# Altium footprint library connector.PcbLib: 67 footprints (part 4 of 5)
Each footprint in its own frame and in the unit in brackets; x right, y up, seen from the top. Pads: shape width x height; smd on the part's side, far side on the other; paste and mask are expansions set on the pad; w line width, h text height; cw(c..) or ccw(c..) is an arc to the next point about the centre after c.
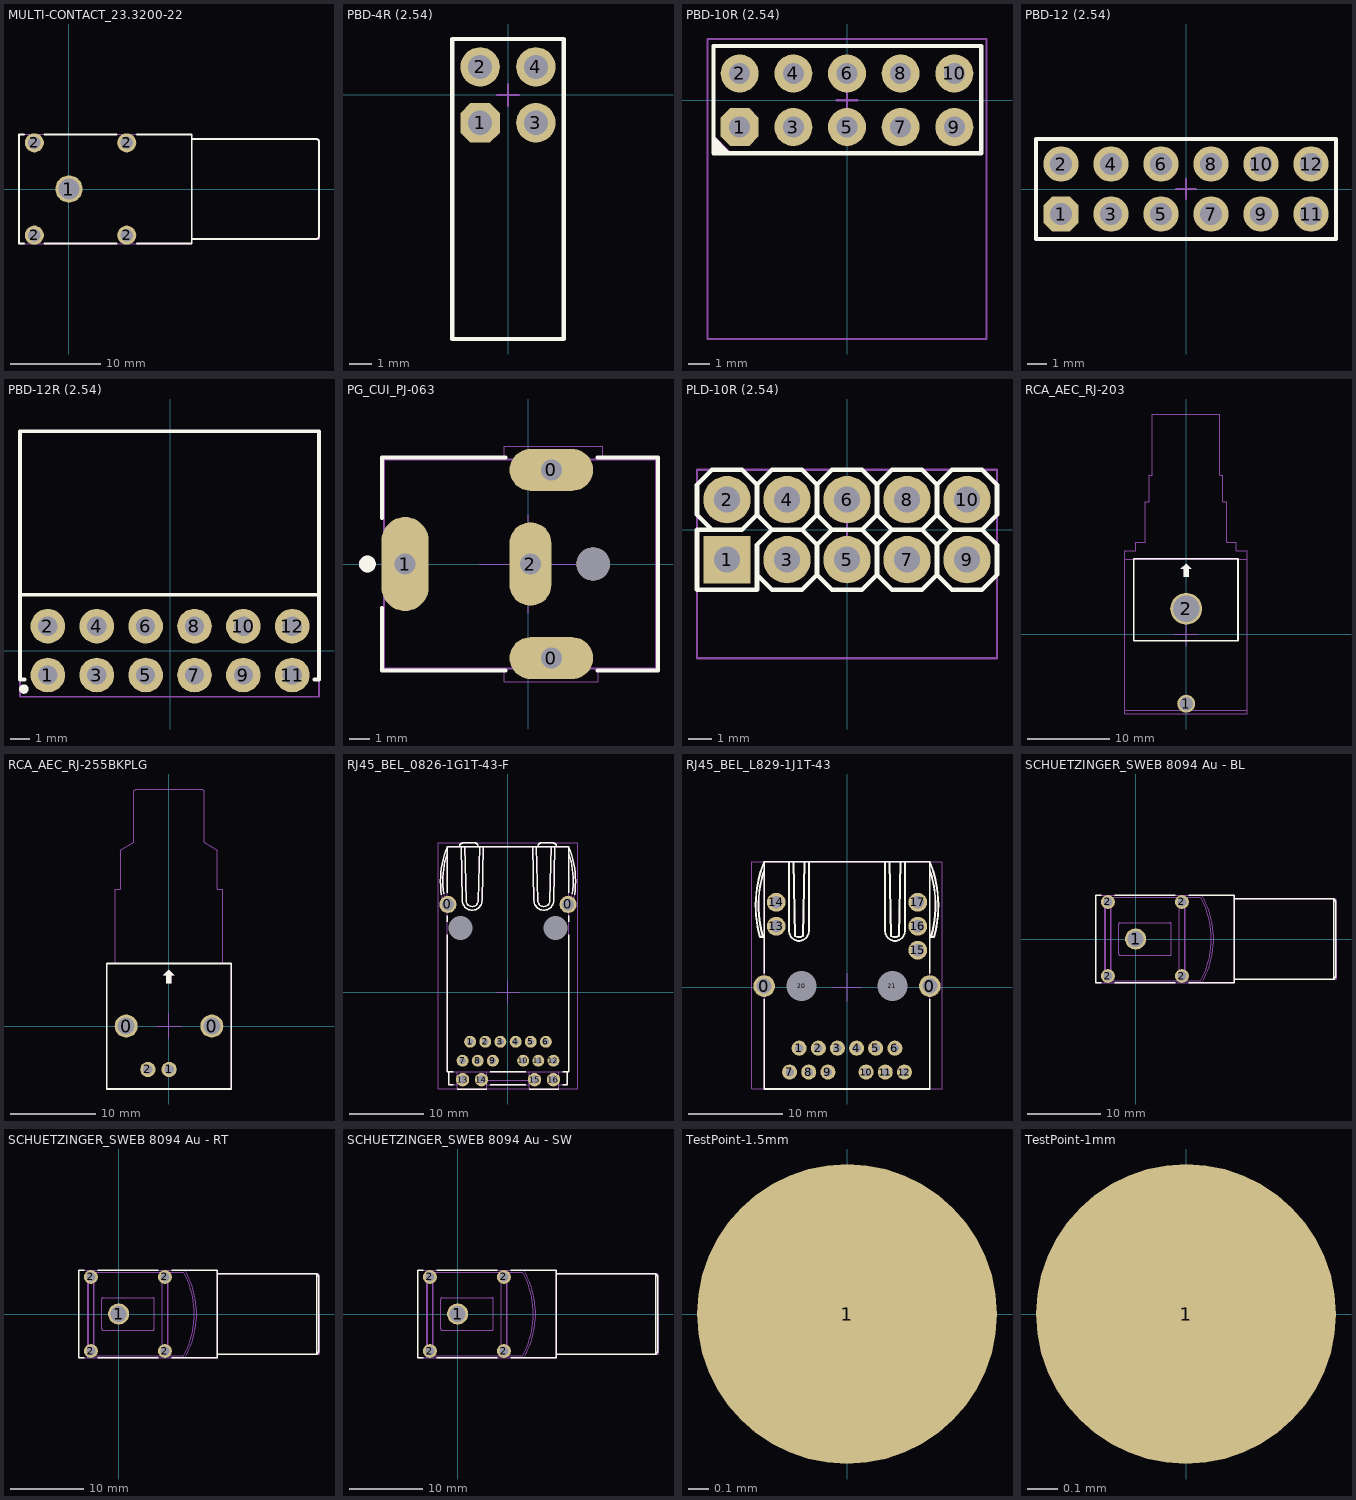
[diagram p3: the footprints below, top view; thin cyan lines are the x and y axes]

## MULTI-CONTACT_23.3200-22 [mm] "Multi-Contact Red Insulated Ш 4mm Angled Socket SLB4-I/90 For Banana 4mm"
height 11.5
pads (5):
  round 3 hole 2.3: 1(0,0)
  round 2.1 hole 1.4: 2(-3.81,-5.08) 2(-3.81,5.08) 2(6.35,-5.08) 2(6.35,5.08)
Top Overlay:
  lines w0.2: -4.931,-6 -5.5,-6 -5.5,6 -4.931,6 ; -2.689,-6 5.229,-6 ; -2.689,6 5.229,6 ; 7.471,-6 13.5,-6 13.5,6 7.471,6 ; 13.5,-5.5 27.2,-5.5 ccw(c27.2,-5.2) 27.5,-5.2 27.5,5.2 ccw(c27.2,5.2) 27.2,5.5 13.5,5.5
Mechanical 1:
  lines w0.1: 13.5,-5.5 27.2,-5.5 ccw(c27.2,-5.2) 27.5,-5.2 27.5,5.2 ccw(c27.2,5.2) 27.2,5.5 13.5,5.5 ; -5.5,-6 13.5,-6 13.5,6 -5.5,6 -5.5,-6
Mechanical 15:
  lines w0.1: -1,0 0,0 ; 0,-1 0,0 ; 0,1 0,0 ; 1,0 0,0 ; 13.5,-5.5 27.5,-5.5 27.5,5.5 13.5,5.5 ; -5.5,-6 13.5,-6 13.5,6 -5.5,6 -5.5,-6
3D body "MULTI-CONTACT_23.3200-22.stp": height 12.3, standoff -3.4, extent -5.5,-6 27.5,6

## PBD-4R (2.54) [mm] "PBD-4"
height 10
pads (4):
  oct 1.8x1.8 hole 1.1: 1(-1.27,-1.27)
  round 1.8 hole 1.1: 2(-1.27,1.27) 3(1.27,-1.27) 4(1.27,1.27)
Top Overlay:
  lines w0.2: -2.54,-11.1 2.54,-11.1 2.54,2.54 -2.54,2.54 -2.54,-11.1
Mechanical 1:
  lines w0.1: -2.54,-11.1 2.54,-11.1 2.54,2.54 -2.54,2.54 -2.54,-11.1
Mechanical 15:
  lines w0.1: -0.5,0 0.5,0 ; 0,-0.5 0,0.5 ; -2.54,-11.1 2.54,-11.1 2.54,2.54 -2.54,2.54 -2.54,-11.1
3D body "User Library-PBD-4R.STEP": height 5.08, standoff -3.5, extent -2.54,-11.102 2.54,1.502

## PBD-10R (2.54) [mm]
pads (10):
  oct 1.8x1.8 hole 1: 1(-5.08,-1.27)
  round 1.8 hole 1: 2(-5.08,1.27) 3(-2.54,-1.27) 4(-2.54,1.27) 5(0,-1.27) 6(0,1.27) 7(2.54,-1.27) 8(2.54,1.27) 9(5.08,-1.27) 10(5.08,1.27)
Top Overlay:
  region: -5.4,-2.5 -5.5,-2.5 -6.38,-1.62 -6.38,-2.51
  lines w0.2: -6.325,-2.51 -6.325,2.57 6.35,2.57 6.35,-2.51 -6.325,-2.51
Mechanical 1:
  region: -5.45,-2.5 -6.35,-1.6 -6.35,-2.485 -6.325,-2.51
  lines w0.1: -6.325,-2.51 6.35,-2.51 6.35,2.57 -6.325,2.57 -6.325,-2.51
Mechanical 15:
  lines w0.1: -0.5,0 0.5,0 ; 0,-0.5 0,0.5 ; -6.6,-11.3 -6.6,2.9 6.6,2.9 6.6,-11.3 -6.6,-11.3
3D body "User Library-PBD-10R.STEP": height 5.15, standoff -3.35, extent -6.35,-11.1 6.35,1.5

## PBD-12 (2.54) [mm] "PBD-12"
height 10
pads (12):
  oct 1.8x1.8 hole 1.1: 1(-6.35,-1.27)
  round 1.8 hole 1.1: 2(-6.35,1.27) 3(-3.81,-1.27) 4(-3.81,1.27) 5(-1.27,-1.27) 6(-1.27,1.27) 7(1.27,-1.27) 8(1.27,1.27) 9(3.81,-1.27) 10(3.81,1.27) 11(6.35,-1.27) 12(6.35,1.27)
Top Overlay:
  lines w0.2: -7.62,-2.54 -7.62,2.54 7.62,2.54 7.62,-2.54 -7.62,-2.54
Mechanical 1:
  lines w0.1: -7.62,-2.54 -7.62,2.54 7.62,2.54 7.62,-2.54 -7.62,-2.54
Mechanical 15:
  lines w0.1: -0.5,0 0.5,0 ; 0,-0.5 0,0.5 ; -7.62,-2.54 7.62,-2.54 7.62,2.54 -7.62,2.54 -7.62,-2.54
3D body "PBD-6.STEP": height 8.5, standoff -3, extent -0.01,-2.54 7.61,2.54
3D body "PBD-6.STEP": height 8.5, standoff -3, extent -7.61,-2.54 0.01,2.54

## PBD-12R (2.54) [mm]
pads (13):
  round 1.8 hole 1: 1(-6.35,-1.27) 2(-6.35,1.27) 3(-3.81,-1.27) 4(-3.81,1.27) 5(-1.27,-1.27) 6(-1.27,1.27) 7(1.27,-1.27) 8(1.27,1.27) 9(3.81,-1.27) 10(3.81,1.27) 11(6.35,-1.27) 12(6.35,1.27)
  round 0.5 on Top Overlay: ""(-7.6,-2)
Top Overlay:
  lines w0.2: -7.8,2.9 7.74,2.9 ; -7.56,-1.5 -7.8,-1.5 -7.8,11.4 7.74,11.4 7.74,-1.5 7.5,-1.5
Mechanical 1:
  lines w0.1: -7.8,-2.4 -7.8,11.4 7.74,11.4 7.74,-2.4 -7.8,-2.4
Mechanical 15:
  lines w0.1: -7.8,-2.4 -7.8,11.4 7.74,11.4 7.74,-2.4 -7.8,-2.4
3D body "PLD-2x6R.STEP": height 5.02, standoff -3.48, extent -7.8,-1.5 7.74,11.4

## PG_CUI_PJ-063 [mm]
pads (5):
  oval 4x2 hole 1 square: 0(1.1,-4.5) 0(1.1,4.5)
  oval 2.25x4.5 hole 1 square: 1(-5.9,0)
  oval 2x4 hole 1 square: 2(0.1,0)
  round 1.6 hole 1.6 unplated: ""(3.1,0)
Top Overlay:
  circle w0.4: c-7.7,0 r0.2
  lines w0.2: -7,-2.1 -7,-5.1 -1.1,-5.1 ; -7,2.2 -7,5.1 -1.1,5.1 ; 3.3,-5.1 6.2,-5.1 6.2,5.099 3.3,5.099
Mechanical 1:
  circle w0.4: c-7.7,0 r0.2
  lines w0.1: -6.9,-5 6.1,-5 6.1,5 -6.9,5 -6.9,-5
Mechanical 15:
  lines w0.05: -2.35,0 2.35,0 ; 0,-2.35 0,2.35 ; -6.9,-5 -1.15,-5 -1.15,-5.625 3.35,-5.625 3.35,-5 6.101,-5 6.101,5 3.55,5 3.55,5.625 -1.15,5.625 -1.15,5 -6.9,5 -6.9,2.7 -6.9,-2 -6.9,-5
3D body "CUI_DEVICES_PJ-063BH.step": height 9, standoff -3, extent -6.9,-5.15 6.1,5.15

## PLD-10R (2.54) [mm]
height 10
pads (10):
  rect 2x2 hole 1.1: 1(-5.08,-1.27)
  round 2 hole 1.1: 2(-5.08,1.27) 3(-2.54,-1.27) 4(-2.54,1.27) 5(0,-1.27) 6(0,1.27) 7(2.54,-1.27) 8(2.54,1.27) 9(5.08,-1.27) 10(5.08,1.27)
Top Overlay:
  lines w0.2: -5.715,0 -6.35,0.635 -6.35,1.905 -5.715,2.54 ; -3.81,-1.905 -3.175,-2.54 -1.905,-2.54 -1.27,-1.905 ; -5.715,2.54 -4.445,2.54 ; -5.715,2.54 -4.445,2.54 ; -4.445,2.54 -3.81,1.905 ; -3.81,0.635 -3.81,1.905 ; -3.81,0.635 -4.445,0 -6.35,0 -6.35,-2.55 -3.81,-2.55 -3.81,-0.635 -3.175,0 ; -3.81,0.635 -3.175,0 ; -3.81,1.905 -3.175,2.54 ; -3.175,0 -1.905,0 ; -3.175,2.54 -1.905,2.54 ; -3.175,2.54 -1.905,2.54 ; -1.905,0 -1.27,-0.635 ; -1.905,0 -1.27,0.635 ; -1.905,2.54 -1.27,1.905 ; -1.27,-1.905 -0.635,-2.54 0.635,-2.54 1.27,-1.905 ; -1.27,-1.905 -1.27,-0.635 ; -1.27,-0.635 -0.635,0 ; -1.27,0.635 -1.27,1.905 ; -1.27,0.635 -0.635,0 ; -1.27,1.905 -0.635,2.54 ; -0.635,0 0.635,0 ; -0.635,2.54 0.635,2.54 ; -0.635,2.54 0.635,2.54 ; 0.635,0 1.27,-0.635 ; 0.635,0 1.27,0.635 ; 0.635,2.54 1.27,1.905 ; 1.27,-1.905 1.905,-2.54 3.175,-2.54 3.81,-1.905 ; 1.27,-1.905 1.27,-0.635 ; 1.27,-0.635 1.905,0 ; 1.27,0.635 1.27,1.905 ; 1.27,0.635 1.905,0 ; 1.27,1.905 1.905,2.54 ; 1.905,0 3.175,0 ; 1.905,2.54 3.175,2.54 ; 1.905,2.54 3.175,2.54 ; 3.175,0 3.81,-0.635 ; 3.175,0 3.81,0.635 ; 3.175,2.54 3.81,1.905 ; 3.81,-1.905 3.81,-0.635 ; 3.81,-1.905 4.445,-2.54 5.715,-2.54 6.35,-1.905 6.35,-0.635 5.715,0 ; 3.81,-0.635 4.445,0 ; 3.81,0.635 4.445,0 ; 3.81,0.635 3.81,1.905 ; 3.81,1.905 4.445,2.54 ; 4.445,0 5.715,0 ; 4.445,2.54 5.715,2.54 ; 4.445,2.54 5.715,2.54 ; 5.715,0 6.35,0.635 6.35,1.905 5.715,2.54
Mechanical 1:
  lines w0.1: -5.715,0 -6.35,0.635 -6.35,1.905 -5.715,2.54 -4.445,2.54 -3.81,1.905 -3.175,2.54 -1.905,2.54 -1.27,1.905 ; -3.81,-1.905 -3.175,-2.54 -1.905,-2.54 -1.27,-1.905 ; -3.175,0 -1.905,0 ; -3.175,0 -3.81,0.635 -4.445,0 -6.35,0 -6.35,-2.54 -3.81,-2.54 -3.81,-0.635 -3.175,0 ; -1.905,0 -1.27,0.635 ; -1.905,0 -1.27,-0.635 ; -1.27,-1.905 -0.635,-2.54 0.635,-2.54 1.27,-1.905 ; -1.27,-1.905 -1.27,-0.635 ; -1.27,-0.635 -0.635,0 ; -1.27,0.635 -0.635,0 ; -1.27,0.635 -1.27,1.905 ; -1.27,1.905 -0.635,2.54 0.635,2.54 1.27,1.905 ; -0.635,0 0.635,0 ; 0.635,0 1.27,0.635 ; 0.635,0 1.27,-0.635 ; 1.27,-1.905 1.905,-2.54 3.175,-2.54 3.81,-1.905 ; 1.27,-1.905 1.27,-0.635 ; 1.27,-0.635 1.905,0 ; 1.27,0.635 1.905,0 ; 1.27,0.635 1.27,1.905 ; 1.27,1.905 1.905,2.54 3.175,2.54 3.81,1.905 ; 1.905,0 3.175,0 ; 3.175,0 3.81,0.635 ; 3.175,0 3.81,-0.635 ; 3.81,-1.905 4.445,-2.54 5.715,-2.54 6.35,-1.905 6.35,-0.635 5.715,0 ; 3.81,-1.905 3.81,-0.635 ; 3.81,-0.635 4.445,0 ; 3.81,0.635 4.445,0 ; 3.81,0.635 3.81,1.905 ; 3.81,1.905 4.445,2.54 5.715,2.54 6.35,1.905 6.35,0.635 5.715,0 ; 4.445,0 5.715,0
Mechanical 15:
  lines w0.1: -0.5,0 0.5,0 ; 0,-0.5 0,0.5 ; -6.35,-5.45 -6.35,2.54 6.35,2.54 6.35,-5.45 -6.35,-5.45
3D body "PLD-10R1.step": height 5.08, standoff -3, extent -6.35,-11.4 6.35,1.64

## RCA_AEC_RJ-203 [mm]
pads (2):
  round 2.2 hole 1.7: 1(0,-8.5)
  round 3.9 hole 3.2: 2(0,3.1)
Top Overlay:
  region: -0.32,7.988 -0.638,7.988 -0.003,8.623 0.632,7.988 0.315,7.988 0.315,7.035 -0.32,7.035
  lines w0.2: -6.4,-0.8 -6.4,9.2 6.322,9.2 6.322,-0.8 -6.4,-0.8
Mechanical 1:
  region: -0.322,7.989 -0.64,7.989 -0.005,8.624 0.63,7.989 0.313,7.989 0.313,7.036 -0.322,7.036
  lines w0.1: -7.527,9.15 -7.527,10.2 -6.181,10.2 -6.181,11.202 -5,11.202 -5,16.2 -4.5,16.2 -4.5,19.4 -4.151,19.4 -4.151,26.9 4.1,26.9 4.1,19.4 4.449,19.4 4.449,16.2 4.949,16.2 4.949,11.202 6.13,11.202 6.13,10.2 7.476,10.2 7.476,9.15 ; -7.526,-9.3 -7.526,9.15 7.475,9.15 7.475,-9.3 -7.526,-9.3
Mechanical 15:
  lines w0.1: -1.5,0 1.5,0 ; 0,-1.5 0,1.5 ; -7.527,-9.753 -7.527,9.15 7.476,9.15 7.476,-9.753 -7.527,-9.753
3D body "RJ-203_alti2.STEP": height 13.87, standoff -1.98, extent -7.525,-9.3 7.475,26.9

## RCA_AEC_RJ-255BKPLG [mm]
pads (4):
  round 2.7 hole 2: 0(-5.025,0) 0(5.05,0)
  round 1.8 hole 1.1: 1(0.025,-5.1) 2(-2.475,-5.1)
Top Overlay:
  region: -0.335,5.976 -0.653,5.976 -0.018,6.611 0.617,5.976 0.3,5.976 0.3,5.024 -0.335,5.024
  lines w0.2: -7.325,-7.4 -7.325,7.375 7.35,7.375 7.35,-7.4 -7.325,-7.4
Mechanical 1:
  region: -0.335,5.976 -0.653,5.976 -0.018,6.611 0.617,5.976 0.3,5.976 0.3,5.024 -0.335,5.024
  lines w0.1: -6.325,7.375 -6.325,16.1 -5.695,16.1 -5.7,20.7 -4.132,21.612 -4.132,27.7 -3.925,27.9 3.95,27.9 4.15,27.693 4.15,21.605 5.718,20.693 5.713,16.093 6.343,16.093 6.343,7.375 ; -7.325,-7.4 -7.325,7.375 7.35,7.375 7.35,-7.4 -7.325,-7.4
Mechanical 15:
  lines w0.1: -1.5,0 1.5,0 ; 0,-1.5 0,1.5 ; -7.325,-7.4 7.35,-7.4 7.35,7.375 -7.325,7.375 -7.325,-7.4
3D body "User Library-rj255.STEP": height 16.29, standoff -2.19, extent -7.989,-7.412 8.011,27.888

## RJ45_BEL_0826-1G1T-43-F [mm] "1 Port, Green/Green LEDs, RJ45 10/100/1000 Gigabit Ethernet, MagJack Connector Module"
height 13.61
pads (20):
  round 2.3 hole 1.6: 0(-8.065,11.748) 0(8.065,11.748)
  round 1.6 hole 0.9: 1(-5.08,-6.668) 2(-3.048,-6.668) 3(-1.016,-6.668) 4(1.016,-6.668) 5(3.048,-6.668) 6(5.08,-6.668) 7(-6.096,-9.208) 8(-4.064,-9.208) 9(-2.032,-9.208) 10(2.032,-9.208) 11(4.064,-9.208) 12(6.096,-9.208)
  round 1.8 hole 1.1: 13(-6.096,-11.748) 14(-3.556,-11.748) 15(3.556,-11.748) 16(6.096,-11.748)
  round 1 hole 3.2 unplated mask+1.1: 19(-6.35,8.573) 20(6.35,8.573)
Top Overlay:
  lines w0.2: -8.924,13.038 cw(c3.316,14.847) -8.15,19.498 ; -8.642,13.186 cw(c3.316,14.847) -8.15,18.628 ; -8.15,7.701 -8.15,-10.703 -7.95,-10.703 ; -8.15,9.444 -8.15,10.2 ; -8.15,13.295 -8.15,19.498 ; -7.325,-12.403 -7.95,-12.403 -7.95,-10.703 ; -7.325,-10.703 -7.95,-10.703 ; -6.826,-13.003 -2.826,-13.003 ; -6.5,19.498 cw(c-6,19.498) -6,19.998 -4.5,19.998 cw(c-4.5,19.498) -4,19.498 ; -6.3,19.498 -6.12,12.284 ccw(c-4.8,12.284) -3.48,12.284 -3.3,19.498 ; -5.8,19.498 -5.619,12.284 ccw(c-4.8,12.284) -3.981,12.264 -3.8,19.498 ; -2.4,-12.403 2.4,-12.403 ; -2.4,-10.703 2.4,-10.703 ; 2.826,-13.003 6.826,-13.003 ; 3.3,19.498 3.48,12.284 ccw(c4.8,12.284) 6.12,12.284 6.3,19.498 ; 3.8,19.498 3.981,12.264 ccw(c4.8,12.284) 5.619,12.284 5.8,19.498 ; 4,19.498 cw(c4.5,19.498) 4.5,19.998 6,19.998 cw(c6,19.498) 6.5,19.498 ; 7.325,-12.403 7.95,-12.403 7.95,-10.703 ; 7.325,-10.703 7.95,-10.703 ; 8.15,7.701 8.15,-10.703 7.95,-10.703 ; 8.15,9.444 8.15,10.2 ; 8.15,13.295 8.15,19.498 ; 8.15,18.628 cw(c-3.316,14.847) 8.642,13.186 ; 8.924,13.038 ccw(c-3.316,14.847) 8.15,19.498 ; -8.15,19.498 8.15,19.498
Mechanical 1:
  lines w0.1: -8.15,18.628 ccw(c3.316,14.847) -8.306,11.579 -8.595,11.498 cw(c3.316,14.847) -8.15,19.498 ; -7.95,-10.703 -7.95,-12.403 -6.826,-12.403 ; -6.826,-10.703 -6.826,-13.003 -2.826,-13.003 -2.826,-10.703 ; -6.5,19.498 cw(c-6,19.498) -6,19.998 -4.5,19.998 cw(c-4.5,19.498) -4,19.498 ; -6.3,19.498 -6.12,12.284 ccw(c-4.8,12.284) -3.48,12.284 -3.3,19.498 ; -5.8,19.498 -5.619,12.284 ccw(c-4.8,12.284) -3.981,12.264 -3.8,19.498 ; -2.826,-12.403 2.826,-12.403 ; -2.826,-11.803 2.826,-11.803 ; 2.826,-10.703 2.826,-13.003 6.826,-13.003 6.826,-10.703 ; 3.3,19.498 3.48,12.284 ccw(c4.8,12.284) 6.12,12.284 6.3,19.498 ; 3.8,19.498 3.981,12.264 ccw(c4.8,12.284) 5.619,12.284 5.8,19.498 ; 4,19.498 cw(c4.5,19.498) 4.5,19.998 6,19.998 cw(c6,19.498) 6.5,19.498 ; 6.826,-12.403 7.95,-12.403 7.95,-10.703 ; 8.15,18.628 cw(c-3.316,14.847) 8.306,11.579 8.595,11.498 ccw(c-3.316,14.847) 8.15,19.498 ; -8.15,19.498 -8.15,-10.703 8.15,-10.703 8.15,19.498 ; -8.15,19.498 8.15,19.498
Mechanical 15:
  lines w0.1: -1.5,0 1.5,0 ; 0,-1.5 0,1.5 ; -9.375,-13 -9.375,20 9.375,20 9.375,-13 -9.375,-13
3D body "BEL_0826-1G1T-43-F.stp": height 14.3, standoff -3.68, extent -9.054,-13.002 9.054,19.998

## RJ45_BEL_L829-1J1T-43 [mm] "1 Port, Yellow/Green-Orange LEDs, Gigabit Ethernet, MagJack Connector Module"
height 11.3
pads (21):
  round 2.3 hole 1.6: 0(-8.79,0.125) 0(8.79,0.125)
  round 1.6 hole 0.9: 1(-5.08,-6.475) 2(-3.048,-6.475) 3(-1.016,-6.475) 4(1.016,-6.475) 5(3.048,-6.475) 6(5.08,-6.475) 7(-6.096,-9.015) 8(-4.064,-9.015) 9(-2.032,-9.015) 10(2.032,-9.015) 11(4.064,-9.015) 12(6.096,-9.015)
  round 2 hole 1.3: 13(-7.52,6.475) 14(-7.52,9.015) 15(7.52,3.935) 16(7.52,6.475) 17(7.52,9.015)
  round 1 hole 3.2 unplated mask+1.1: 20(-4.825,0.125) 21(4.825,0.125)
Top Overlay:
  lines w0.2: -8.79,-1.275 -8.79,-10.805 8.79,-10.805 8.79,-1.275 ; -8.79,1.525 -8.79,13.325 ; -8.79,12.455 ccw(c2.676,8.675) -8.923,5.325 -9.235,5.325 cw(c2.676,8.675) -8.79,13.325 ; -6.147,5.975 -6.147,13.325 ; -6.147,5.976 ccw(c-5.097,5.975) -4.047,5.974 -4.047,13.325 ; -5.7,13.325 -5.503,5.432 ; -5.466,5.412 ccw(c-5.097,6.145) -4.692,5.432 -4.494,13.325 ; 4.047,5.975 4.047,13.325 ; 4.047,5.976 ccw(c5.097,5.975) 6.147,5.974 6.147,13.325 ; 4.494,13.325 4.692,5.432 ; 4.728,5.412 ccw(c5.097,6.145) 5.503,5.432 5.7,13.325 ; 8.79,1.525 8.79,13.325 ; 8.79,12.455 cw(c-2.676,8.675) 8.923,5.325 9.235,5.325 ccw(c-2.676,8.675) 8.79,13.325 ; -8.79,13.325 8.79,13.325
Mechanical 1:
  lines w0.1: -8.79,12.455 ccw(c2.676,8.675) -8.923,5.325 -9.235,5.325 cw(c2.676,8.675) -8.79,13.325 ; -6.147,5.975 -6.147,13.325 ; -6.147,5.976 ccw(c-5.097,5.975) -4.047,5.974 -4.047,13.325 ; -5.7,13.325 -5.503,5.432 ; -5.466,5.412 ccw(c-5.097,6.145) -4.692,5.432 -4.494,13.325 ; 4.047,5.975 4.047,13.325 ; 4.047,5.976 ccw(c5.097,5.975) 6.147,5.974 6.147,13.325 ; 4.494,13.325 4.692,5.432 ; 4.728,5.412 ccw(c5.097,6.145) 5.503,5.432 5.7,13.325 ; 8.79,12.455 cw(c-2.676,8.675) 8.923,5.325 9.235,5.325 ccw(c-2.676,8.675) 8.79,13.325 ; -8.79,13.325 8.79,13.325 ; -8.79,13.325 -8.79,-10.805 8.79,-10.805 8.79,13.325
Mechanical 15:
  lines w0.1: -1.5,0 1.5,0 ; 0,-1.5 0,1.5 ; -10.1,-10.8 10.1,-10.8 10.1,13.325 -10.1,13.325 -10.1,-10.8
3D body "BEL_L829-1J1T-43.stp": height 12.21, standoff -3.3, extent -9.697,-10.805 9.693,13.325

## SCHUETZINGER_SWEB 8094 Au - BL [mm] "Blue Insulated Ш 4mm Angled Socket For Banana 4mm"
height 11.5
pads (5):
  round 2.9 hole 2.2: 1(0,0)
  round 1.9 hole 1.2: 2(-3.81,-5.08) 2(-3.81,5.08) 2(6.35,-5.08) 2(6.35,5.08)
Top Overlay:
  lines w0.2: -4.728,-6 -5.5,-6 -5.5,6 -4.728,6 ; -2.892,-6 5.432,-6 ; -2.892,6 5.432,6 ; 7.268,-6 13.5,-6 13.5,6 7.268,6 ; 13.5,-5.5 27.2,-5.5 ; 13.5,5.5 27.2,5.5 ; 27.2,-5.5 27.2,5.5 ; 27.2,-5.5 27.5,-5.2 27.5,5.2 27.2,5.5
Mechanical 1:
  lines w0.1: -4.25,-6 -4.25,6 ; 9.111,-6 ccw(c-1.495,0) 9.111,6 ; 13.5,-5.5 27.2,-5.5 ; 13.5,5.5 27.2,5.5 ; 27.2,-5.5 27.2,5.5 ; 27.2,-5.5 27.5,-5.2 27.5,5.2 27.2,5.5 ; -5.5,-6 -5.5,6 13.5,6 13.5,-6 -5.5,-6 ; -4.2,-5.48 -4.2,5.48 -3.4,5.48 -3.4,-5.48 -4.2,-5.48 ; -3.35,-5.7 -3.35,5.7 5.96,5.7 5.96,-5.7 -3.35,-5.7 ; -2.35,-2 ccw(c-2.1,-2) -2.1,-2.25 4.66,-2.25 ccw(c4.66,-2) 4.91,-2 4.91,2 ccw(c4.66,2) 4.66,2.25 -2.1,2.25 ccw(c-2.1,2) -2.35,2 -2.35,-2 ; 5.96,-5.48 5.965,5.481 6.76,5.481 6.76,-5.48 5.96,-5.48 ; 6.81,-5.7 6.81,5.7 8.935,5.7 cw(c-1.495,0) 8.935,-5.7 6.81,-5.7
Mechanical 15:
  lines w0.1: -1,0 0,0 ; 0,-1 0,0 ; 0,1 0,0 ; 1,0 0,0 ; 13.5,-5.5 27.5,-5.5 27.5,5.5 13.5,5.5 ; -5.5,-6 13.5,-6 13.5,6 -5.5,6 -5.5,-6
3D body "SCHUETZINGER_SWEB 8094 Au - BL.stp": height 12.3, standoff -3.67, extent -5.5,-6 27.5,6

## SCHUETZINGER_SWEB 8094 Au - RT [mm] "Red Insulated Ш 4mm Angled Socket For Banana 4mm"
height 11.5
pads (5):
  round 2.9 hole 2.2: 1(0,0)
  round 1.9 hole 1.2: 2(-3.81,-5.08) 2(-3.81,5.08) 2(6.35,-5.08) 2(6.35,5.08)
Top Overlay:
  lines w0.2: -4.728,-6 -5.5,-6 -5.5,6 -4.728,6 ; -2.892,-6 5.432,-6 ; -2.892,6 5.432,6 ; 7.268,-6 13.5,-6 13.5,6 7.268,6 ; 13.5,-5.5 27.2,-5.5 ; 13.5,5.5 27.2,5.5 ; 27.2,-5.5 27.5,-5.2 27.5,5.2 27.2,5.5 ; 27.2,-5.5 27.2,5.5
Mechanical 1:
  lines w0.1: -4.25,-6 -4.25,6 ; 9.111,-6 ccw(c-1.495,0) 9.111,6 ; 13.5,-5.5 27.2,-5.5 ; 13.5,5.5 27.2,5.5 ; 27.2,-5.5 27.2,5.5 ; 27.2,-5.5 27.5,-5.2 27.5,5.2 27.2,5.5 ; -5.5,-6 -5.5,6 13.5,6 13.5,-6 -5.5,-6 ; -4.2,-5.48 -4.2,5.48 -3.4,5.48 -3.4,-5.48 -4.2,-5.48 ; -3.35,-5.7 -3.35,5.7 5.96,5.7 5.96,-5.7 -3.35,-5.7 ; -2.35,-2 ccw(c-2.1,-2) -2.1,-2.25 4.66,-2.25 ccw(c4.66,-2) 4.91,-2 4.91,2 ccw(c4.66,2) 4.66,2.25 -2.1,2.25 ccw(c-2.1,2) -2.35,2 -2.35,-2 ; 5.96,-5.48 5.965,5.481 6.76,5.481 6.76,-5.48 5.96,-5.48 ; 6.81,-5.7 6.81,5.7 8.935,5.7 cw(c-1.495,0) 8.935,-5.7 6.81,-5.7
Mechanical 15:
  lines w0.1: -1,0 0,0 ; 0,-1 0,0 ; 0,1 0,0 ; 1,0 0,0 ; 13.5,-5.5 27.5,-5.5 27.5,5.5 13.5,5.5 ; -5.5,-6 13.5,-6 13.5,6 -5.5,6 -5.5,-6
3D body "SCHUETZINGER_SWEB 8094 Au - RT.stp": height 12.3, standoff -3.67, extent -5.5,-6 27.5,6

## SCHUETZINGER_SWEB 8094 Au - SW [mm] "Black Insulated Ш 4mm Angled Socket For Banana 4mm"
height 11.5
pads (5):
  round 2.9 hole 2.2: 1(0,0)
  round 1.9 hole 1.2: 2(-3.81,-5.08) 2(-3.81,5.08) 2(6.35,-5.08) 2(6.35,5.08)
Top Overlay:
  lines w0.2: -4.728,-6 -5.5,-6 -5.5,6 -4.728,6 ; -2.892,-6 5.432,-6 ; -2.892,6 5.432,6 ; 7.268,-6 13.5,-6 13.5,6 7.268,6 ; 13.5,-5.5 27.2,-5.5 ; 13.5,5.5 27.2,5.5 ; 27.2,-5.5 27.5,-5.2 27.5,5.2 27.2,5.5 ; 27.2,-5.5 27.2,5.5
Mechanical 1:
  lines w0.1: -4.25,-6 -4.25,6 ; 9.111,-6 ccw(c-1.495,0) 9.111,6 ; 13.5,-5.5 27.2,-5.5 ; 13.5,5.5 27.2,5.5 ; 27.2,-5.5 27.2,5.5 ; 27.2,-5.5 27.5,-5.2 27.5,5.2 27.2,5.5 ; -5.5,-6 -5.5,6 13.5,6 13.5,-6 -5.5,-6 ; -4.2,-5.48 -4.2,5.48 -3.4,5.48 -3.4,-5.48 -4.2,-5.48 ; -3.35,-5.7 -3.35,5.7 5.96,5.7 5.96,-5.7 -3.35,-5.7 ; -2.35,-2 ccw(c-2.1,-2) -2.1,-2.25 4.66,-2.25 ccw(c4.66,-2) 4.91,-2 4.91,2 ccw(c4.66,2) 4.66,2.25 -2.1,2.25 ccw(c-2.1,2) -2.35,2 -2.35,-2 ; 5.96,-5.48 5.965,5.481 6.76,5.481 6.76,-5.48 5.96,-5.48 ; 6.81,-5.7 6.81,5.7 8.935,5.7 cw(c-1.495,0) 8.935,-5.7 6.81,-5.7
Mechanical 15:
  lines w0.1: -1,0 0,0 ; 0,-1 0,0 ; 0,1 0,0 ; 1,0 0,0 ; 13.5,-5.5 27.5,-5.5 27.5,5.5 13.5,5.5 ; -5.5,-6 -5.5,6 13.5,6 13.5,-6 -5.5,-6
3D body "SCHUETZINGER_SWEB 8094 Au - SW.stp": height 12.3, standoff -3.67, extent -5.5,-6 27.5,6

## TestPoint-1.5mm [mm]
pads (1):
  round 1.5 smd paste-2539.97: 1(0,0)

## TestPoint-1mm [mm]
pads (1):
  round 1 smd paste-2539.97: 1(0,0)